# Altium footprint library HidroanaPCBLib1.PcbLib: 88 footprints (part 1 of 6)
Each footprint in its own frame and in the unit in brackets; x right, y up, seen from the top. Pads: shape width x height; smd on the part's side, far side on the other; paste and mask are expansions set on the pad; w line width, h text height; cw(c..) or ccw(c..) is an arc to the next point about the centre after c.
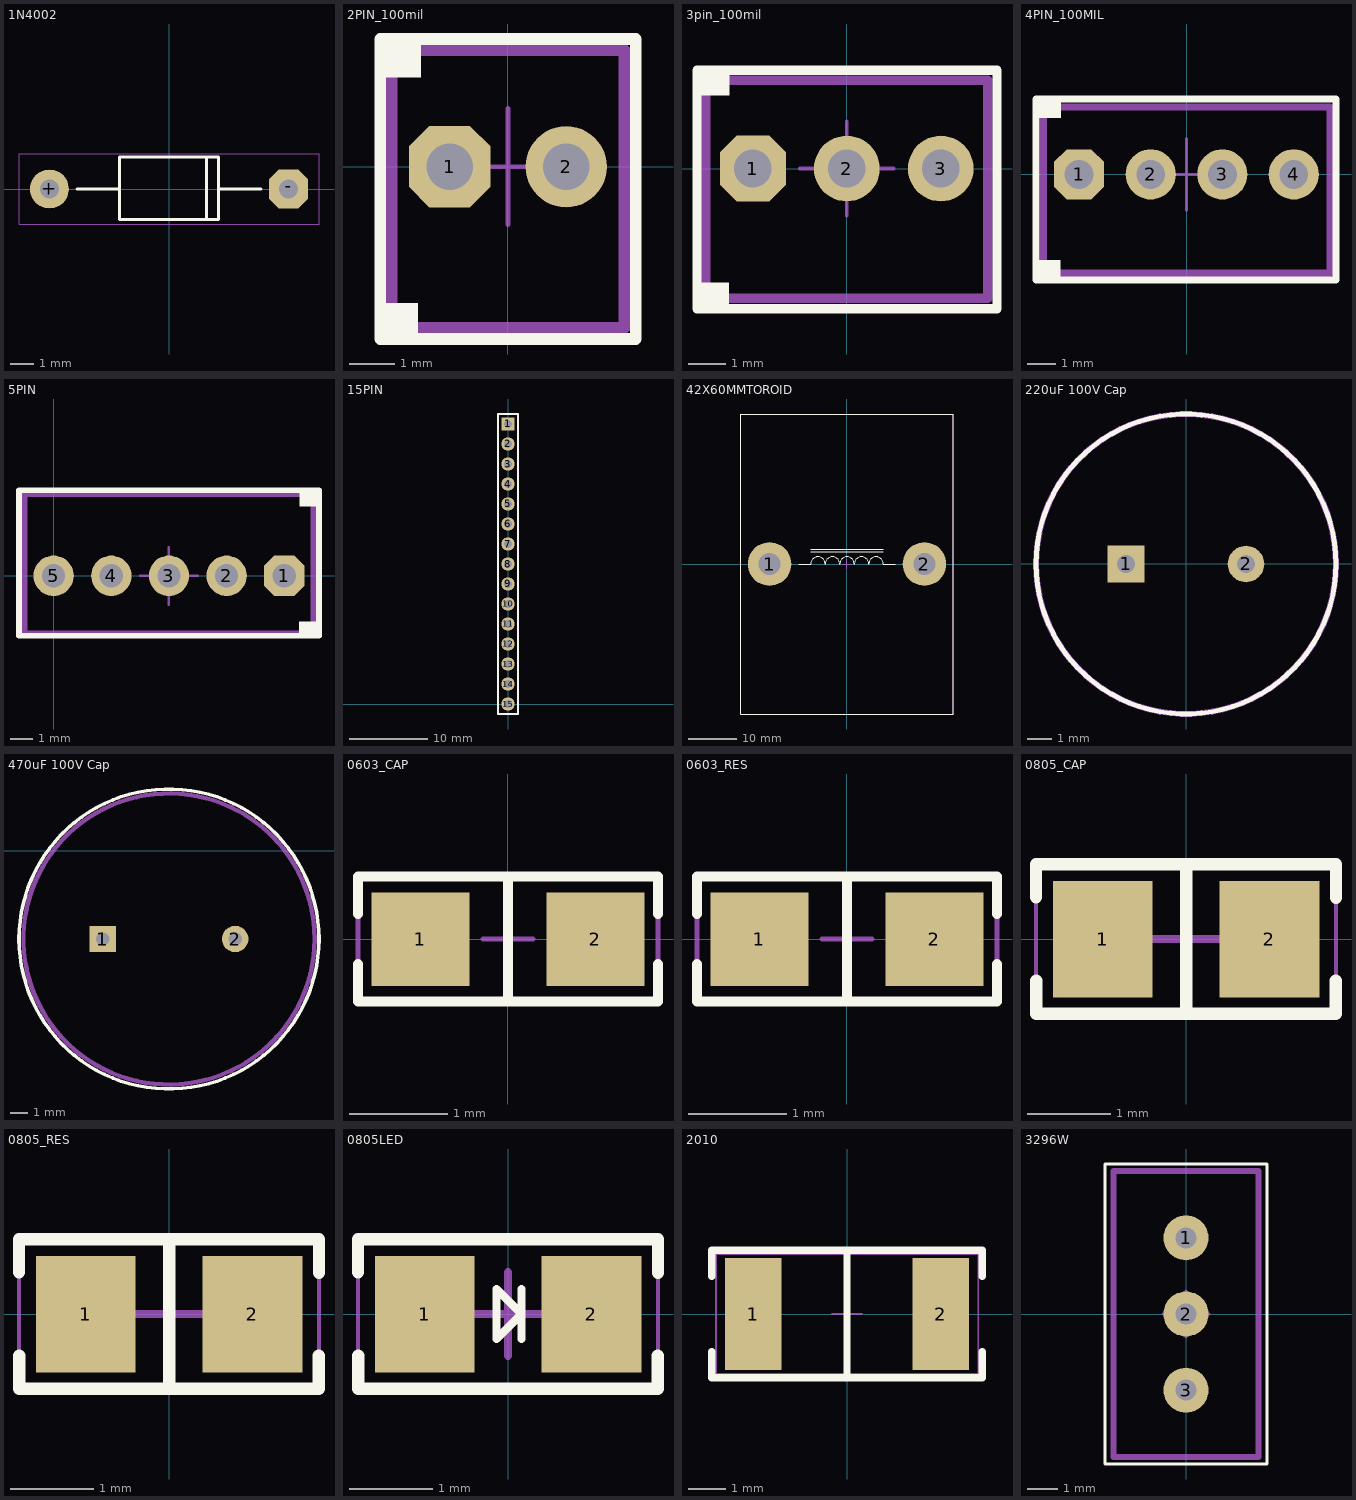
[diagram p0: the footprints below, top view; thin cyan lines are the x and y axes]

## 1N4002 [mm]
pads (2):
  round 1.65 hole 0.8: +(-5.08,0)
  oct 1.65x1.65 hole 0.8: -(5.08,0)
Top Overlay:
  lines w0.127: 1.6,1.3 1.6,-1.3 ; -2.1,-1.3 1.6,-1.3 ; -2.1,-1.3 -2.1,0 ; -2.1,-1.3 1.6,-1.3 ; -2.1,-1.3 -2.1,0 ; -2.1,0 -3.9,0 -2.1,0 ; -2.1,0 -2.1,1.35 ; -2.1,0 -2.1,1.35 ; -2.1,1.35 2.1,1.35 ; -2.1,1.35 1.6,1.35 ; 1.6,-1.3 2.1,-1.3 ; 1.6,-1.3 2.1,-1.3 ; 1.6,-1.3 1.6,1.35 ; 1.6,1.35 2.1,1.35 ; 2.1,-1.3 2.1,0 ; 2.1,-1.3 2.1,0 ; 2.1,0 3.9,0 2.1,0 ; 2.1,0 2.1,1.35 ; 2.1,0 2.1,1.35
Top Component Center:
  lines w0.05: -6.375,-1.5 -6.375,1.5 6.375,1.5 6.375,-1.5 -6.375,-1.5
Top Designator:
  text ".Designator" at -2.859,-0.287 h1.27
3D body "1N4002 DO-41-2.step": height 3.23, standoff -2.09, extent -5.512,-1.36 5.512,1.36

## 2PIN_100mil [mil]
pads (2):
  oct 70x70 hole 40.16 mask+1.97: 1(-50,0)
  round 70 hole 40.16 mask+1.97: 2(50,0)
Top Overlay:
  rectangle: -107.12,-146.86 -77.12,-116.86
  rectangle: -104.84,76.48 -74.84,106.48
  lines w10: -109.54,-147.92 109.59,-147.92 109.59,109.67 -109.54,109.67 -109.54,-147.92
Top Component Center:
  lines w3.94: -48.23,0 51.77,0 ; 0,-50 0,50
  lines w10: -100,-138.33 100,-138.33 100,100 -100,100 -100,-138.33
Top Designator:
  text ".Designator" at -157.85,-115.84 h70
3D body "DS1070-2 (WF-2 CONNFLY).step": height 448.82, standoff -129.92, extent -98.23,-137.8 101.77,94.49

## 3pin_100mil [mil]
pads (3):
  oct 70x70 hole 40.16 mask+1.97: 1(-100,0)
  round 70 hole 40.16 mask+1.97: 2(0,0) 3(100,0)
Top Overlay:
  region: -124.72,107.6 -154.72,107.6 -154.72,77.6 -124.72,77.6
  region: -125.44,-121.07 -155.44,-121.07 -155.44,-151.07 -125.44,-151.07
  lines w10: -159.46,-149.03 159.77,-149.03 159.77,104.8 -159.46,104.8 -159.46,-149.03
Top Component Center:
  lines w3.94: -50,0 50,0 ; 0,-50 0,50
  lines w10: -150,-137.9 150,-137.9 150,93.87 -150,93.87 -150,-137.9
Top Designator:
  text ".Designator" at -157.85,-115.84 h70
3D body "DS1070-3 (WF-3 CONNFLY).step": height 448.82, standoff -129.92, extent -150,-137.79 150,94.49

## 4PIN_100MIL [mil]
pads (4):
  oct 70x70 hole 40.16 mask+1.97: 1(-150.17,-0.03)
  round 70 hole 40.16 mask+1.97: 2(-50.17,-0.03) 3(49.83,-0.03) 4(149.49,-0.09)
Top Overlay:
  region: -175.53,108.91 -205.53,108.91 -205.53,78.91 -175.53,78.91
  region: -176.25,-119.76 -206.25,-119.76 -206.25,-149.76 -176.25,-149.76
  lines w10: -210.24,-147.52 208.4,-147.52 208.4,104.96 -210.24,104.96 -210.24,-147.52
Top Component Center:
  lines w3.94: -50,0 50,0 ; 0,-50 0,50
  lines w10: -200,-137.9 200,-137.9 200,93.87 -200,93.87 -200,-137.9
Top Designator:
  text ".Designator" at -107.85,-115.84 h70
3D body "User Library-DS1070-4 (WF-4 CONNFLY).step": height 452.76, standoff -125.98, extent -200,-138.41 200,93.87

## 5PIN [mil]
pads (5):
  oct 70x70 hole 40.16 mask+1.97: 1(400,0)
  round 70 hole 40.16 mask+1.97: 2(300,0) 3(200,0) 4(100,0) 5(0,0)
Top Overlay:
  rectangle: 425.36,-108.94 455.36,-78.94
  rectangle: 426.08,119.73 456.08,149.73
  lines w10: -60,-104.17 -60,148.31 460.11,148.31 460.11,-104.17 -60,-104.17
Top Component Center:
  lines w3.94: 149.83,-0.03 249.83,-0.03 ; 199.83,-50.03 199.83,49.97
  lines w10: -50,-100 -50,141.32 450,141.32 450,-100 -50,-100
Top Designator:
  text ".Designator" at 288.5,108.87 h39.37
3D body "User Library-DS1070-5 (WF-5 CONNFLY).step": height 448.82, standoff -129.92, extent -50.01,-94.5 449.99,137.79

## 15PIN [mm]
pads (15):
  rect 1.7x1.7 hole 1: 1(0,35.56)
  round 1.7 hole 1: 2(0,33.02) 3(0,30.48) 4(0,27.94) 5(0,25.4) 6(0,22.86) 7(0,20.32) 8(0,17.78) 9(0,15.24) 10(0,12.7) 11(0,10.16) 12(0,7.62) 13(0,5.08) 14(0,2.54) 15(0,0)
Top Overlay:
  lines w0.2: -1.27,-1.27 1.27,-1.27 1.27,34.925 1.27,36.83 -1.27,36.83 -1.27,-1.27
Top Designator:
  text ".Designator" at -4.009,-0.402 h1.78
3D body "90120-0775_6215.stp": height 9.25, standoff -2.87, extent -1.25,-1.27 1.25,36.83

## 42X60MMTOROID [mm]
height 65
pads (2):
  round 9 hole 4.5: 1(-16,0) 2(16,0)
Top Overlay:
  lines w0.254: -10,0 -7.5,0 cw(c-6,0) -4.5,0 cw(c-3,0) -1.5,0 cw(c0,0) 1.5,0 cw(c3,0) 4.5,0 cw(c6,0) 7.5,0 10,0 ; -7.5,2.5 7.5,2.5 ; -7.5,3 7.5,3 ; -22,-31 22,-31 22,31 -22,31 -22,-31
Top Component Center:
  lines w0.2: -22,-31 22,-31 22,31 -22,31 -22,-31
  lines w0.254: -1,0 1,0 ; 0,-1 0,1 ; -22,-31 22,-31 22,31 -22,31 -22,-31
Top Designator:
  text ".Designator" at -2.461,-0.287 h1.27
3D body "Part1.STEP": height 60, standoff 0, extent -17.524,-29.881 17.476,30.119

## 220uF 100V Cap [mil]
height 984.25
pads (2):
  rect 60x60 hole 30: 1(-98.43,0)
  round 60 hole 30: 2(98.43,0)
Top Overlay:
  circle w8: c0,0 r246.06
Top Component Center:
  circle w5: c0,0 r246.06
  circle w10: c0,0 r246.06
Top Designator:
  text ".Designator" at -112.54,-11.3 h50
3D body "220uF 100V(12_5x25-5).step": height 984.33, standoff -129.92, extent -246.06,-246.04 246.15,246.06

## 470uF 100V Cap [mil]
pads (2):
  rect 60x60 hole 30: 1(700,-200)
  round 60 hole 30: 2(1000,-200)
Top Overlay:
  circle w8: c850,-200 r340
Top Component Center:
  circle w10: c850,-200 r330
Top Designator:
  text ".Designator" at 737.46,-211.3 h50
3D body "User Library-JAMICON_TK_D(16)F(7_5)L(31_5).step": height 1261.34, standoff -39.06, extent 535.04,-514.96 1166.14,114.96

## 0603_CAP [mm]
pads (2):
  rect 1x0.95 smd mask+0.08: 1(-0.889,0) 2(0.889,0)
Top Overlay:
  lines w0.1: -1.524,-0.254 -1.524,-0.635 1.524,-0.635 1.524,-0.254 ; -1.524,0.254 -1.524,0.635 1.524,0.635 1.524,0.254 ; 0,-0.635 0,0.635
Top Component Center:
  lines w0.05: -0.254,0 0,0 0.254,0 ; 0,-0.254 0,0.254 ; -1.524,-0.635 1.524,-0.635 1.524,0.635 -1.524,0.635 -1.524,-0.635
Top Designator:
  text ".Designator" at -2.859,-0.287 h1.27
3D body "0603_cap.step": height 0.96, standoff 0.1, extent -0.8,-0.4 0.8,0.4

## 0603_RES [mm]
pads (2):
  rect 1x0.95 smd mask+0.08: 1(-0.889,0) 2(0.889,0)
Top Overlay:
  lines w0.1: -1.524,-0.254 -1.524,-0.635 1.524,-0.635 1.524,-0.254 ; -1.524,0.254 -1.524,0.635 1.524,0.635 1.524,0.254 ; 0,-0.635 0,0.635
Top Component Center:
  lines w0.05: -0.254,0 0,0 0.254,0 ; 0,-0.254 0,0.254 ; -1.524,-0.635 1.524,-0.635 1.524,0.635 -1.524,0.635 -1.524,-0.635
Top Designator:
  text ".Designator" at -2.859,-0.287 h1.27
3D body "1609-0603.step": height 0.56, standoff 0, extent -0.85,-0.4 0.85,0.4

## 0805_CAP [mm]
pads (2):
  rect 1.2x1.4 smd: 1(-1,0) 2(1,0)
Top Overlay:
  lines w0.15: -1.801,0.504 -1.801,0.904 ; -1.8,-0.5 -1.8,-0.896 1.8,-0.896 1.8,-0.5 ; -1.8,0.904 1.8,0.904 ; 0,-0.896 0,0.904 ; 1.801,0.498 1.801,0.898
Top Component Center:
  lines w0.05: -1.8,-0.946 1.8,-0.946 1.8,0.954 -1.8,0.954 -1.8,-0.946
  lines w0.1: -0.501,0.004 0.499,0.004 ; -0.001,-0.496 -0.001,0.504
Top Designator:
  text ".Designator" at -2.859,-0.287 h1.27
3D body "0805cap.step": height 0.6, standoff 0, extent -1,-0.625 1,0.625

## 0805_RES [mm]
pads (2):
  rect 1.2x1.4 smd: 1(-1,0) 2(1,0)
Top Overlay:
  lines w0.15: -1.801,0.504 -1.801,0.904 ; -1.8,-0.5 -1.8,-0.896 1.8,-0.896 1.8,-0.5 ; -1.8,0.904 1.8,0.904 ; 0,-0.896 0,0.904 ; 1.801,0.498 1.801,0.898
Top Component Center:
  lines w0.05: -1.8,-0.946 1.8,-0.946 1.8,0.954 -1.8,0.954 -1.8,-0.946
  lines w0.1: -0.501,0.004 0.499,0.004 ; -0.001,-0.496 -0.001,0.504
Top Designator:
  text ".Designator" at -2.859,-0.287 h1.27
3D body "RES_0805.step": height 0.6, standoff 0, extent -1,-0.625 1,0.625

## 0805LED [mm]
pads (2):
  rect 1.2x1.4 smd: 1(-1,0) 2(1,0)
Top Overlay:
  lines w0.1: 0.161,-0.296 0.161,0.304 ; -0.139,-0.296 0.161,0.004 -0.139,0.304 -0.139,-0.296
  lines w0.15: -1.801,0.504 -1.801,0.904 ; -1.8,-0.5 -1.8,-0.896 1.8,-0.896 1.8,-0.5 ; -1.8,0.904 1.8,0.904 ; 1.801,0.498 1.801,0.898
Top Component Center:
  lines w0.05: -1.8,-0.946 -1.8,0.954 1.8,0.954 1.8,-0.946 -1.8,-0.946
  lines w0.1: -0.501,0.004 0.499,0.004 ; -0.001,-0.496 -0.001,0.504
Top Designator:
  text ".Designator" at -2.859,-0.287 h1.27
3D body "ALSRobot-LED0805(R).step": height 1.1, standoff 0, extent -1.01,-0.625 1.01,0.625

## 2010 [mm]
pads (2):
  rrect3% 1.5x3 smd mask+0.127: 1(-2.5,0) 2(2.5,0)
Top Overlay:
  lines w0.2: -3.6,-1 -3.6,-1.7 3.6,-1.7 3.6,-1 ; -3.6,1 -3.6,1.7 3.6,1.7 3.6,1 ; 0,-1.7 0,1.7
Top Component Center:
  lines w0.05: -0.4,0 0,0 ; 0,-0.4 0,0 ; 0,0.4 0,0 ; 0.4,0 0,0 ; -3.498,-1.598 3.499,-1.598 3.499,1.599 -3.498,1.599 -3.498,-1.598
Top Designator:
  text ".Designator" at -2.859,-0.287 h1.27
3D body "2010.step": height 0.55, standoff 0, extent -2.5,-1.26 2.5,1.26

## 3296W [mm] "9.50x4.80x10.00mm, Rectangular"
pads (3):
  round 1.5 hole 0.7: 1(0,2.54) 2(0,0) 3(0,-2.54)
Top Overlay:
  lines w0.1: -2.7,-5 2.7,-5 2.7,5 -2.7,5 -2.7,-5
Top Component Center:
  lines w0.1: -0.762,0 0.762,0 ; 0,-0.762 0,0.762
  lines w0.2: -2.41,-4.765 2.42,-4.765 2.42,4.765 -2.41,4.765 -2.41,-4.765
Top Designator:
  text ".Designator" at -2.859,-0.287 h1.27
3D body "3296W-1-103.stp": height 11.44, standoff -6.58, extent -2.425,-4.75 2.425,4.75